# Altium footprint library connectors_USB_ETH.PcbLib: 71 footprints (part 2 of 5)
Each footprint in its own frame and in the unit in brackets; x right, y up, seen from the top. Pads: shape width x height; smd on the part's side, far side on the other; paste and mask are expansions set on the pad; w line width, h text height; cw(c..) or ccw(c..) is an arc to the next point about the centre after c.
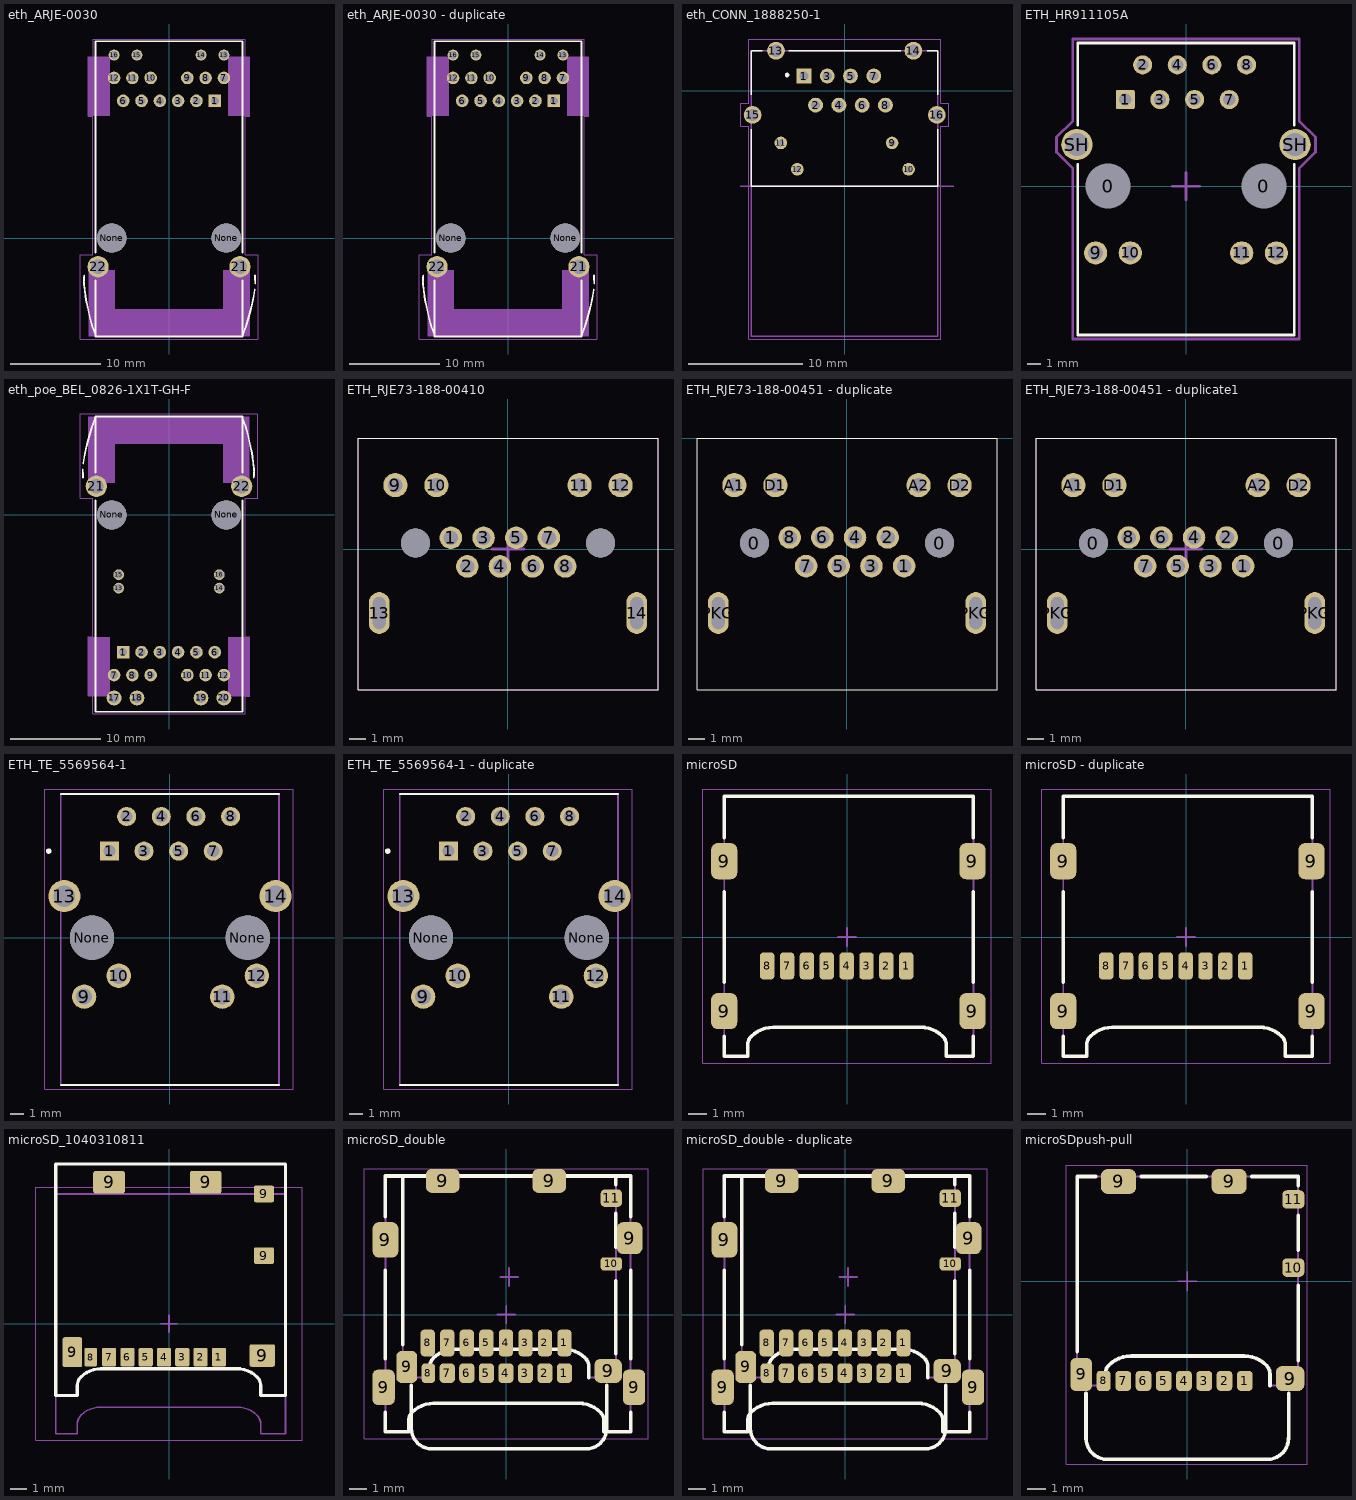
[diagram p1: the footprints below, top view; thin cyan lines are the x and y axes]

## eth_ARJE-0030 [mm] "ARJE-0030 magnet"
pads (20):
  rect 1.398x1.398 hole 0.89: 1(5.08,15.24)
  round 1.398 hole 0.89: 2(3.048,15.24) 3(1.016,15.24) 4(-1.016,15.24) 5(-3.048,15.24) 6(-5.08,15.24) 7(6.096,17.78) 8(4.064,17.78) 9(2.032,17.78) 10(-2.032,17.78) 11(-4.064,17.78) 12(-6.096,17.78)
  round 1.2 hole 0.89: 13(6.1,20.32) 14(3.56,20.32) 15(-3.56,20.32) 16(-6.1,20.32)
  round 2.362 hole 1.575: 21(7.875,-3.175) 22(-7.875,-3.175)
  round 3.25 hole 3.25 unplated: None(-6.35,0) None(6.35,0)
Top Overlay:
  lines w0.2: -9.46,-4.48 -9.42,-5.14 -9.36,-5.75 -9.28,-6.45 -9.22,-6.86 -9.03,-7.68 -8.75,-9 -8.48,-9.9 -8.17,-10.66 ; -9.45,-4.7 -9.44,-4.38 -9.4,-4.15 ; -8.155,-4.7 -8.155,-10.92 8.155,-10.92 8.155,-4.7 ; -8.155,-1.6 -8.155,21.85 8.155,21.85 8.155,-1.6 ; 8.14,-10.83 8.2,-10.74 8.31,-10.45 8.45,-10.04 8.6,-9.61 8.78,-9.05 ; 8.78,-9.02 9.05,-8.02 9.23,-7.26 9.33,-6.84 9.4,-6.4 9.51,-5.72 ; 9.53,-4.16 9.56,-4.56 9.58,-4.83 9.57,-5.03
M1_3D_TOP:
  region: 8.94,-10.92 -8.915,-10.92 -8.915,-7.892 8.94,-7.892
  region: 8.934,-8 5.995,-8 5.995,-3.557 8.934,-3.557
  region: -6.003,-8 -8.915,-8 -8.915,-3.555 -6.003,-3.555
  region: 8.93,13.6 6.555,13.6 6.555,20.104 8.93,20.104
  region: -6.568,13.6 -8.915,13.6 -8.915,20.109 -6.568,20.109
  region: 8.929,13.6 6.555,13.6 6.555,20.102 8.929,20.102
  region: -6.568,13.6 -8.915,13.6 -8.915,20.11 -6.568,20.11
  region: -6.566,13.6 -8.915,13.6 -8.915,20.104 -6.566,20.104
  region: 8.926,13.6 6.555,13.6 6.555,20.095 8.926,20.095
  region: 8.933,-10.92 -8.915,-10.92 -8.915,-7.886 8.933,-7.886
  region: 8.945,-7.87 5.995,-7.87 5.995,-3.562 8.945,-3.562
  region: -6.004,-7.87 -8.915,-7.87 -8.915,-3.555 -6.004,-3.555
  region: 8.939,-10.92 -8.915,-10.92 -8.915,-7.891 8.939,-7.891
  region: -6.011,-7.87 -8.915,-7.87 -8.915,-3.559 -6.011,-3.559
  region: 8.923,-7.87 5.995,-7.87 5.995,-3.553 8.923,-3.553
  lines w0.05: -9.85,-11.2 9.85,-11.2 9.85,-1.85 8.45,-1.85 8.45,13.55 8.95,13.55 8.95,20.1 8.45,20.1 8.45,22.1 -8.45,22.1 -8.45,20.15 -8.95,20.15 -8.95,13.55 -8.45,13.55 -8.45,-1.85 -9.85,-1.85 -9.85,-11.2
3D body "ARJE-0030.STEP": height 16.6, standoff -3.07, extent -10.352,-10.961 10.352,22.06

## eth_ARJE-0030 - duplicate [mm] "ARJE-0030 magnet"
pads (20):
  rect 1.398x1.398 hole 0.89: 1(5.08,15.24)
  round 1.398 hole 0.89: 2(3.048,15.24) 3(1.016,15.24) 4(-1.016,15.24) 5(-3.048,15.24) 6(-5.08,15.24) 7(6.096,17.78) 8(4.064,17.78) 9(2.032,17.78) 10(-2.032,17.78) 11(-4.064,17.78) 12(-6.096,17.78)
  round 1.2 hole 0.89: 13(6.1,20.32) 14(3.56,20.32) 15(-3.56,20.32) 16(-6.1,20.32)
  round 2.362 hole 1.575: 21(7.875,-3.175) 22(-7.875,-3.175)
  round 3.25 hole 3.25 unplated: None(-6.35,0) None(6.35,0)
Top Overlay:
  lines w0.2: -9.46,-4.48 -9.42,-5.14 -9.36,-5.75 -9.28,-6.45 -9.22,-6.86 -9.03,-7.68 -8.75,-9 -8.48,-9.9 -8.17,-10.66 ; -9.45,-4.7 -9.44,-4.38 -9.4,-4.15 ; -8.155,-4.7 -8.155,-10.92 8.155,-10.92 8.155,-4.7 ; -8.155,-1.6 -8.155,21.85 8.155,21.85 8.155,-1.6 ; 8.14,-10.83 8.2,-10.74 8.31,-10.45 8.45,-10.04 8.6,-9.61 8.78,-9.05 ; 8.78,-9.02 9.05,-8.02 9.23,-7.26 9.33,-6.84 9.4,-6.4 9.51,-5.72 ; 9.53,-4.16 9.56,-4.56 9.58,-4.83 9.57,-5.03
M1_3D_TOP:
  region: 8.94,-10.92 -8.915,-10.92 -8.915,-7.892 8.94,-7.892
  region: 8.934,-8 5.995,-8 5.995,-3.557 8.934,-3.557
  region: -6.003,-8 -8.915,-8 -8.915,-3.555 -6.003,-3.555
  region: 8.93,13.6 6.555,13.6 6.555,20.104 8.93,20.104
  region: -6.568,13.6 -8.915,13.6 -8.915,20.109 -6.568,20.109
  region: 8.929,13.6 6.555,13.6 6.555,20.102 8.929,20.102
  region: -6.568,13.6 -8.915,13.6 -8.915,20.11 -6.568,20.11
  region: -6.566,13.6 -8.915,13.6 -8.915,20.104 -6.566,20.104
  region: 8.926,13.6 6.555,13.6 6.555,20.095 8.926,20.095
  region: 8.933,-10.92 -8.915,-10.92 -8.915,-7.886 8.933,-7.886
  region: 8.945,-7.87 5.995,-7.87 5.995,-3.562 8.945,-3.562
  region: -6.004,-7.87 -8.915,-7.87 -8.915,-3.555 -6.004,-3.555
  region: 8.939,-10.92 -8.915,-10.92 -8.915,-7.891 8.939,-7.891
  region: -6.011,-7.87 -8.915,-7.87 -8.915,-3.559 -6.011,-3.559
  region: 8.923,-7.87 5.995,-7.87 5.995,-3.553 8.923,-3.553
  lines w0.05: -9.85,-11.2 9.85,-11.2 9.85,-1.85 8.45,-1.85 8.45,13.55 8.95,13.55 8.95,20.1 8.45,20.1 8.45,22.1 -8.45,22.1 -8.45,20.15 -8.95,20.15 -8.95,13.55 -8.45,13.55 -8.45,-1.85 -9.85,-1.85 -9.85,-11.2
3D body "ARJE-0030.STEP": height 16.6, standoff -3.07, extent -10.352,-10.961 10.352,22.06

## eth_CONN_1888250-1 [mm] "1888250-1"
pads (16):
  rect 1.3x1.3 hole 0.8: 1(-3.556,1.27)
  round 1.3 hole 0.8: 2(-2.54,-1.27) 3(-1.524,1.27) 4(-0.508,-1.27) 5(0.508,1.27) 6(1.524,-1.27) 7(2.54,1.27) 8(3.556,-1.27)
  round 1.1 hole 0.6: 9(4.14,-4.57) 10(5.58,-6.87) 11(-5.58,-4.57) 12(-4.14,-6.87)
  round 1.55 hole 1.05: 13(-6,3.48) 14(6,3.48) 15(-8.045,-2.12) 16(8.045,-2.12)
Top Overlay:
  circle w0.2: c-5.024,1.36 r0.1
  lines w0.127: -8.145,-3.37 -8.145,-8.37 8.145,-8.37 8.145,-3.37 ; -8.145,-0.37 -8.145,3.48 ; -8.1,3.48 -7.2,3.48 ; -4.9,3.48 4.9,3.48 ; 7.2,3.48 8.1,3.48 ; 8.145,-0.37 8.145,3.48
M1_3D_TOP:
  lines w0.05: -9.07,-3.12 -9.07,-1.12 -8.395,-1.12 -8.395,4.505 8.395,4.505 8.395,-1.12 9.07,-1.12 9.07,-3.12 8.395,-3.12 8.395,-21.69 -8.395,-21.69 -8.395,-3.12 -9.07,-3.12
  lines w0.127: -9.1,-8.37 9.5,-8.37 ; -8.145,-21.44 8.145,-21.44 8.145,3.48 -8.145,3.48 -8.145,-21.44
  text "PCB EDGE" at 9.716,-8.363 h1.88
3D body "c-1888250-1-b-3d.stp": height 8.49, standoff -5.29, extent -9.245,-22.519 9.245,4.216

## ETH_HR911105A [mm] "HR911105A"
pads (16):
  round 3 hole 3.3: 0(-5.715,0.01) 0(5.715,0.01)
  rrect20% 1.4x1.4 hole 0.89: 1(-4.45,6.36)
  round 1.4 hole 0.89: 2(-3.18,8.9) 3(-1.91,6.36) 4(-0.64,8.9) 5(0.63,6.36) 6(1.9,8.9) 7(3.17,6.36) 8(4.44,8.9)
  round 1.7 hole 1.1: 9(-6.625,-4.89) 10(-4.085,-4.89) 11(4.085,-4.89) 12(6.625,-4.89)
  round 2.3 hole 1.7: SH(-8,3.06) SH(8,3.06)
Top Overlay:
  lines w0.2: -7.94,1.6 -7.94,-10.9 7.94,-10.9 7.94,1.6 ; -7.94,4.5 -7.94,10.5 7.94,10.5 7.94,4.5
M3_comm_top:
  text ".comment" at -2.6,-2.4 h2
M5_asm_top:
  text ".Designator" at -3.35,2.16 h2
M7_courtyard_top:
  lines w0.2: -1,0.01 1,0.01 ; 0,-0.99 0,1.01 ; -9.5,2.5 -9.5,3.6 -8.3,4.8 -8.3,10.8 8.3,10.8 8.3,4.8 9.5,3.6 9.5,2.5 8.3,1.3 8.3,-11.2 -8.3,-11.2 -8.3,1.3 -9.5,2.5
3D body "HR911105A.step": height 13.6, standoff -2.9, extent -7.94,-10.91 7.94,10.49

## eth_poe_BEL_0826-1X1T-GH-F [mm] "0826-1X1T-GH-F"
pads (24):
  rect 1.398x1.398 hole 0.89: 1(-5.08,-15.24)
  round 1.398 hole 0.89: 2(-3.048,-15.24) 3(-1.016,-15.24) 4(1.016,-15.24) 5(3.048,-15.24) 6(5.08,-15.24) 7(-6.096,-17.78) 8(-4.064,-17.78) 9(-2.032,-17.78) 10(2.032,-17.78) 11(4.064,-17.78) 12(6.096,-17.78)
  round 1.2 hole 0.89: 13(-5.588,-8.13) 14(5.588,-8.13) 15(-5.588,-6.64) 16(5.588,-6.64)
  round 1.65 hole 1.1: 17(-6.096,-20.32) 18(-3.556,-20.32) 19(3.556,-20.32) 20(6.096,-20.32)
  round 2.362 hole 1.575: 21(-8.065,3.175) 22(8.065,3.175)
  round 3.25 hole 3.25 unplated: None(-6.35,0) None(6.35,0)
Top Overlay:
  lines w0.2: -9.57,5.03 -9.58,4.83 -9.56,4.56 -9.53,4.16 ; -9.51,5.72 -9.4,6.4 -9.33,6.84 -9.23,7.26 -9.05,8.02 -8.78,9.02 ; -8.78,9.05 -8.6,9.61 -8.45,10.04 -8.31,10.45 -8.2,10.74 -8.14,10.83 ; -8.155,1.6 -8.155,-21.85 8.155,-21.85 8.155,1.6 ; -8.155,4.7 -8.155,10.92 8.155,10.92 8.155,4.7 ; 8.17,10.66 8.48,9.9 8.75,9 9.03,7.68 9.22,6.86 9.28,6.45 9.36,5.75 9.42,5.14 9.46,4.48 ; 9.4,4.15 9.44,4.38 9.45,4.7
M1_3D_TOP:
  region: -8.94,10.92 8.915,10.92 8.915,7.892 -8.94,7.892
  region: -8.934,8 -5.995,8 -5.995,3.557 -8.934,3.557
  region: 6.003,8 8.915,8 8.915,3.555 6.003,3.555
  region: -8.93,-13.6 -6.555,-13.6 -6.555,-20.104 -8.93,-20.104
  region: 6.568,-13.6 8.915,-13.6 8.915,-20.109 6.568,-20.109
  region: -8.929,-13.6 -6.555,-13.6 -6.555,-20.102 -8.929,-20.102
  region: 6.568,-13.6 8.915,-13.6 8.915,-20.11 6.568,-20.11
  region: 6.566,-13.6 8.915,-13.6 8.915,-20.104 6.566,-20.104
  region: -8.926,-13.6 -6.555,-13.6 -6.555,-20.095 -8.926,-20.095
  region: -8.933,10.92 8.915,10.92 8.915,7.886 -8.933,7.886
  region: -8.945,7.87 -5.995,7.87 -5.995,3.562 -8.945,3.562
  region: 6.004,7.87 8.915,7.87 8.915,3.555 6.004,3.555
  region: -8.939,10.92 8.915,10.92 8.915,7.891 -8.939,7.891
  region: 6.011,7.87 8.915,7.87 8.915,3.559 6.011,3.559
  region: -8.923,7.87 -5.995,7.87 -5.995,3.553 -8.923,3.553
  lines w0.05: -9.85,1.85 -8.45,1.85 -8.45,-13.55 -8.95,-13.55 -8.95,-20.1 -8.45,-20.1 -8.45,-22.1 8.45,-22.1 8.45,-20.15 8.95,-20.15 8.95,-13.55 8.45,-13.55 8.45,1.85 9.85,1.85 9.85,11.2 -9.85,11.2 -9.85,1.85

## ETH_RJE73-188-00410 [mm] "RJE73-188-00410"
pads (16):
  round 1.4 hole 0.89: 1(-3.55,0.705) 2(-2.53,-1.075) 3(-1.52,0.705) 4(-0.5,-1.075) 5(0.51,0.705) 6(1.53,-1.075) 7(2.54,0.705) 8(3.56,-1.075)
  round 1.5 hole 0.89: 9(-7,3.975) 10(-4.45,3.975) 11(4.45,3.975) 12(7,3.975)
  oval 1.3x2.6 hole 0.8 slot 2 at 90 deg: 13(-8,-3.975) 14(8,-3.975)
  round 1.8 hole 1.8: ""(-5.75,0.375) ""(5.75,0.375)
Top Overlay:
  lines w0.05: -9.322,-8.725 -9.322,6.875 9.322,6.875 9.322,-8.725 -9.322,-8.725
M3_comm_top:
  text ".comment" at -2.8,-0.2 h2
M5_asm_top:
  lines w0.05: -9.322,-8.725 9.322,-8.725 9.322,6.875 -9.322,6.875 -9.322,-8.725
  text ".Designator" at -3.4,5.9 h2
M7_courtyard_top:
  lines w0.05: -9.322,-8.725 9.322,-8.725 9.322,6.875 -9.322,6.875 -9.322,-8.725
  lines w0.2: -1,0 1,0 ; 0,-1 0,1
3D body "M-RJE73-188-00XX1-REVT1.STEP": height 13.32, standoff -2.05, extent -9.871,-8.634 9.876,6.615

## ETH_RJE73-188-00451 - duplicate [mm] "RJE73-188-00451"
pads (16):
  round 1.8 hole 1.8: 0(-5.75,-6.5) 0(5.75,-6.5)
  round 1.4 hole 0.89: 1(3.55,-7.93) 2(2.53,-6.15) 3(1.52,-7.93) 4(0.5,-6.15) 5(-0.51,-7.93) 6(-1.53,-6.15) 7(-2.54,-7.93) 8(-3.56,-6.15)
  round 1.5 hole 0.89: A1(-7,-2.9) A2(4.45,-2.9) D1(-4.45,-2.9) D2(7,-2.9)
  oval 1.3x2.6 hole 0.8 slot 2 at 90 deg: PKG(-8,-10.85) PKG(8,-10.85)
Top Overlay:
  lines w0.05: -9.322,-15.6 9.322,-15.6 9.322,0 -9.322,0 -9.322,-15.6
3D body "M-RJE73-188-00XX1-REVT1.STEP": height 13.32, standoff -2.05, extent -9.871,-15.509 9.876,-0.26

## ETH_RJE73-188-00451 - duplicate1 [mm] "RJE73-188-00451"
pads (16):
  round 1.8 hole 1.8: 0(-5.75,0.375) 0(5.75,0.375)
  round 1.4 hole 0.89: 1(3.55,-1.055) 2(2.53,0.725) 3(1.52,-1.055) 4(0.5,0.725) 5(-0.51,-1.055) 6(-1.53,0.725) 7(-2.54,-1.055) 8(-3.56,0.725)
  round 1.5 hole 0.89: A1(-7,3.975) A2(4.45,3.975) D1(-4.45,3.975) D2(7,3.975)
  oval 1.3x2.6 hole 0.8 slot 2 at 90 deg: PKG(-8,-3.975) PKG(8,-3.975)
Top Overlay:
  lines w0.05: -9.322,-8.725 -9.322,6.875 9.322,6.875 9.322,-8.725 -9.322,-8.725
M3_comm_top:
  text ".comment" at -2.8,-0.2 h2
M5_asm_top:
  lines w0.05: -9.322,-8.725 9.322,-8.725 9.322,6.875 -9.322,6.875 -9.322,-8.725
  text ".Designator" at -3.4,5.9 h2
M7_courtyard_top:
  lines w0.05: -9.322,-8.725 9.322,-8.725 9.322,6.875 -9.322,6.875 -9.322,-8.725
  lines w0.2: -1,0 1,0 ; 0,-1 0,1
3D body "M-RJE73-188-00XX1-REVT1.STEP": height 13.32, standoff -2.05, extent -9.871,-8.634 9.876,6.615

## ETH_TE_5569564-1 [mm]
pads (16):
  rect 1.398x1.398 hole 0.89: 1(-4.445,6.35)
  round 1.398 hole 0.89: 2(-3.175,8.89) 3(-1.905,6.35) 4(-0.635,8.89) 5(0.635,6.35) 6(1.905,8.89) 7(3.175,6.35) 8(4.445,8.89)
  round 1.785 hole 1.19: 9(-6.295,-4.32) 10(-3.755,-2.79) 11(3.835,-4.32) 12(6.375,-2.79)
  round 2.355 hole 1.57: 13(-7.745,3.05) 14(7.745,3.05)
  round 3.25 hole 3.25 unplated: None(-5.715,0) None(5.715,0)
Top Overlay:
  circle w0.2: c-8.89,6.35 r0.1
  lines w0.127: -8,-10.8 8,-10.8 ; -8,10.54 8,10.54
M1_3D_TOP:
  circle w0.2: c-4.445,6.35 r0.1
  lines w0.05: -9.195,-11.095 -9.195,10.905 9.055,10.905 9.055,-11.095 -9.195,-11.095
  lines w0.127: -8,-10.8 -8,10.54 ; 8,-10.8 8,10.54
3D body "c-5569564-1-e1-3d.stp": height 14.72, standoff -3.94, extent -8.001,-10.786 8.001,10.55

## ETH_TE_5569564-1 - duplicate [mm]
pads (16):
  rect 1.398x1.398 hole 0.89: 1(-4.445,6.35)
  round 1.398 hole 0.89: 2(-3.175,8.89) 3(-1.905,6.35) 4(-0.635,8.89) 5(0.635,6.35) 6(1.905,8.89) 7(3.175,6.35) 8(4.445,8.89)
  round 1.785 hole 1.19: 9(-6.295,-4.32) 10(-3.755,-2.79) 11(3.835,-4.32) 12(6.375,-2.79)
  round 2.355 hole 1.57: 13(-7.745,3.05) 14(7.745,3.05)
  round 3.25 hole 3.25 unplated: None(-5.715,0) None(5.715,0)
Top Overlay:
  circle w0.2: c-8.89,6.35 r0.1
  lines w0.127: -8,-10.8 8,-10.8 ; -8,10.54 8,10.54
M1_3D_TOP:
  circle w0.2: c-4.445,6.35 r0.1
  lines w0.05: -9.195,-11.095 9.055,-11.095 9.055,10.905 -9.195,10.905 -9.195,-11.095
  lines w0.127: -8,-10.8 -8,10.54 ; 8,-10.8 8,10.54

## microSD [mm] "5190008-X9H, IPC High Density"
height 1.75
pads (12):
  rrect50% 0.8x1.5 smd: 1(3.28,-1.6) 2(2.18,-1.6) 3(1.08,-1.6) 4(-0.02,-1.6) 5(-1.12,-1.6) 6(-2.22,-1.6) 7(-3.32,-1.6) 8(-4.42,-1.6)
  rrect50% 1.45x2 smd: 9(-6.8,-4.1) 9(-6.8,4.2) 9(6.95,-4.1) 9(6.95,4.2)
Top Overlay:
  lines w0.2: -6.8,-5.5 -6.8,-6.6 -5.5,-6.6 -5.5,-5.983 cw(c-4.817,-5.983) -5.3,-5.5 cw(c-4.093,-6.707) -4.093,-5 4.293,-5 ; -6.8,-2.5 -6.8,2.5 ; -6.8,5.5 -6.8,7.8 7,7.8 7,5.5 ; 4.093,-5 cw(c4.093,-6.707) 5.3,-5.5 cw(c4.817,-5.983) 5.5,-5.983 5.5,-6.6 7,-6.6 7,-5.5 ; 7,-2.5 7,2.5
Mechanical 13:
  lines w0.1: -6.8,-6.6 -5.5,-6.6 -5.5,-5.99 cw(c-4.8,-5.99) -5.295,-5.495 cw(c-4.1,-6.69) -4.1,-5 4.093,-5 cw(c4.093,-6.707) 5.3,-5.5 cw(c4.817,-5.983) 5.5,-5.983 5.5,-6.6 7,-6.6 7,7.8 -6.8,7.8 -6.8,-6.6
Mechanical 15:
  lines w0.05: -8,-7 -8,8.2 8,8.2 8,-7 -8,-7
  lines w0.1: -0.5,0 0.5,0 ; 0,-0.5 0,0.5
3D body "472192001.stp": height 2.06, standoff 0.17, extent -7.2,-6.65 7.4,7.85

## microSD - duplicate [mm] "5190008-X9H, IPC High Density"
height 1.75
pads (12):
  rrect50% 0.8x1.5 smd: 1(3.28,-1.6) 2(2.18,-1.6) 3(1.08,-1.6) 4(-0.02,-1.6) 5(-1.12,-1.6) 6(-2.22,-1.6) 7(-3.32,-1.6) 8(-4.42,-1.6)
  rrect50% 1.45x2 smd: 9(-6.8,-4.1) 9(-6.8,4.2) 9(6.95,-4.1) 9(6.95,4.2)
Top Overlay:
  lines w0.2: -6.8,-5.5 -6.8,-6.6 -5.5,-6.6 -5.5,-5.983 cw(c-4.817,-5.983) -5.3,-5.5 cw(c-4.093,-6.707) -4.093,-5 4.293,-5 ; -6.8,-2.5 -6.8,2.5 ; -6.8,5.5 -6.8,7.8 7,7.8 7,5.5 ; 4.093,-5 cw(c4.093,-6.707) 5.3,-5.5 cw(c4.817,-5.983) 5.5,-5.983 5.5,-6.6 7,-6.6 7,-5.5 ; 7,-2.5 7,2.5
Mechanical 13:
  lines w0.1: -6.8,-6.6 -6.8,7.8 7,7.8 7,-6.6 5.5,-6.6 5.5,-5.983 ccw(c4.817,-5.983) 5.3,-5.5 ccw(c4.093,-6.707) 4.093,-5 -4.1,-5 ccw(c-4.1,-6.69) -5.295,-5.495 ccw(c-4.8,-5.99) -5.5,-5.99 -5.5,-6.6 -6.8,-6.6
Mechanical 15:
  lines w0.05: -8,-7 8,-7 8,8.2 -8,8.2 -8,-7
  lines w0.1: -0.5,0 0.5,0 ; 0,-0.5 0,0.5
3D body "472192001.stp": height 2.06, standoff 0.17, extent -7.2,-6.65 7.4,7.85

## microSD_1040310811 [mm] "1040310811, CONN MICRO SD CARD PUSH-PULL R/A"
height 1.75
pads (14):
  rrect20% 0.85x1.1 smd: 1(3,-2) 2(1.9,-2) 3(0.8,-2) 4(-0.3,-2) 5(-1.4,-2) 6(-2.5,-2) 7(-3.6,-2)
  rrect20% 0.75x1.1 smd: 8(-4.7,-2)
  rrect20% 1.17x1.8 smd: 9(-5.8,-1.7)
  rrect20% 1.9x1.35 smd: 9(-3.6,8.5) 9(2.2,8.5)
  rrect20% 1.55x1.35 smd: 9(5.6,-1.9)
  rrect20% 1.2x1 smd: 9(5.7,4.1) 9(5.7,7.8)
Top Overlay:
  lines w0.2: 4.093,-2.7 cw(c4.093,-4.407) 5.3,-3.2 cw(c4.817,-3.683) 5.5,-3.683 5.5,-4.3 7,-4.3 7,-3.2 7,2.5 7,9.6 -6.8,9.6 -6.8,5.5 -6.8,-3.2 -6.8,-4.3 -5.5,-4.3 -5.5,-3.683 cw(c-4.817,-3.683) -5.3,-3.2 cw(c-4.093,-4.407) -4.093,-2.7 4.293,-2.7
Mechanical 13:
  lines w0.1: -6.8,-6.6 -5.5,-6.6 -5.5,-5.99 cw(c-4.8,-5.99) -5.295,-5.495 cw(c-4.1,-6.69) -4.1,-5 4.093,-5 cw(c4.093,-6.707) 5.3,-5.5 cw(c4.817,-5.983) 5.5,-5.983 5.5,-6.6 7,-6.6 7,7.8 -6.8,7.8 -6.8,-6.6
Mechanical 15:
  lines w0.05: -8,-7 -8,8.2 8,8.2 8,-7 -8,-7
  lines w0.1: -0.5,0 0.5,0 ; 0,-0.5 0,0.5
3D body "User Library-1040310811.STEP": height 1.44, standoff -0.01, extent -6.075,-2.3 5.875,9.1

## microSD_double [mm] "1040310811 + 0472192001"
height 1.75
pads (26):
  rrect50% 0.85x1.1 smd: 1(3.28,-3.3) 2(2.18,-3.3) 3(1.08,-3.3) 4(-0.02,-3.3) 5(-1.12,-3.3) 6(-2.22,-3.3) 7(-3.32,-3.3)
  rrect50% 0.8x1.5 smd: 1(3.28,-1.6) 2(2.18,-1.6) 3(1.08,-1.6) 4(-0.02,-1.6) 5(-1.12,-1.6) 6(-2.22,-1.6) 7(-3.32,-1.6) 8(-4.42,-1.6)
  rrect50% 0.75x1.1 smd: 8(-4.385,-3.3)
  rrect50% 1.25x2 smd: 9(-6.9,-4.1) 9(7.2,-4.1)
  rrect50% 1.45x2 smd: 9(-6.8,4.2)
  rrect50% 1.17x1.8 smd: 9(-5.6,-2.95)
  rrect50% 1.9x1.35 smd: 9(-3.575,7.525) 9(2.425,7.525)
  rrect50% 1.55x1.35 smd: 9(5.74,-3.175)
  rrect50% 1.45x1.8 smd: 9(6.95,4.3)
  rrect50% 1.2x0.75 smd: 10(5.915,2.85)
  rrect50% 1.2x1 smd: 11(5.915,6.55)
Top Overlay:
  lines w0.2: -6.8,-5.5 -6.8,-6.6 -5.5,-6.6 -5.5,-5.983 cw(c-4.817,-5.983) -5.3,-5.5 cw(c-4.093,-6.707) -4.093,-5 4.293,-5 ; -6.8,-2.5 -6.8,2.5 ; -6.8,5.5 -6.8,7.8 7,7.8 7,5.5 ; -5.825,-1.7 -5.825,7.8 -4.825,7.8 ; -5.343,-6.463 -5.343,-3.988 ; -5.338,-6.412 ccw(c-4.188,-6.412) -4.188,-7.562 ; -4.3,-3.55 -4.3,-2.933 cw(c-3.617,-2.933) -4.1,-2.45 cw(c-2.893,-3.657) -2.893,-1.95 3.243,-1.95 cw(c3.243,-3.657) 4.45,-2.45 cw(c3.967,-2.933) 4.65,-2.933 4.65,-3.55 ; -4.243,-7.562 4.503,-7.562 ccw(c4.503,-6.412) 5.653,-6.412 ; -2.325,7.8 1.175,7.8 ; 3.675,7.8 6.175,7.8 6.175,7.3 ; 4.093,-5 cw(c4.093,-6.707) 5.3,-5.5 cw(c4.817,-5.983) 5.5,-5.983 5.5,-6.6 7,-6.6 7,-5.5 ; 5.657,-6.463 5.657,-3.988 ; 6.175,-2.2 6.175,1.9 ; 6.175,3.8 6.175,5.7 ; 7,-2.5 7,2.5
Mechanical 13:
  lines w0.1: -5.825,-3.55 -5.825,7.8 6.175,7.8 6.175,-3.55 ; -5.8,-3.55 -4.3,-3.55 -4.3,-2.933 cw(c-3.617,-2.933) -4.1,-2.45 cw(c-2.893,-3.657) -2.893,-1.95 3.268,-1.95 ; 3.243,-1.95 cw(c3.243,-3.657) 4.45,-2.45 cw(c3.967,-2.933) 4.65,-2.933 4.65,-3.55 6.15,-3.55 ; -6.8,-6.6 -5.5,-6.6 -5.5,-5.99 cw(c-4.8,-5.99) -5.295,-5.495 cw(c-4.1,-6.69) -4.1,-5 4.093,-5 cw(c4.093,-6.707) 5.3,-5.5 cw(c4.817,-5.983) 5.5,-5.983 5.5,-6.6 7,-6.6 7,7.8 -6.8,7.8 -6.8,-6.6
Mechanical 15:
  lines w0.05: -8,-7 -8,8.2 8,8.2 8,-7 -8,-7
  lines w0.1: -0.5,0 0.5,0 ; -0.343,2.113 0.657,2.113 ; 0,-0.5 0,0.5 ; 0.157,1.613 0.157,2.612
3D body "1040310811.stp": height 1.44, standoff -0.01, extent -5.8,-3.55 6.15,7.85
3D body "472192001.stp": height 2.06, standoff 0.17, extent -7.2,-6.65 7.4,7.85

## microSD_double - duplicate [mm] "1040310811 + 0472192001"
height 1.75
pads (26):
  rrect50% 0.85x1.1 smd: 1(3.28,-3.3) 2(2.18,-3.3) 3(1.08,-3.3) 4(-0.02,-3.3) 5(-1.12,-3.3) 6(-2.22,-3.3) 7(-3.32,-3.3)
  rrect50% 0.8x1.5 smd: 1(3.28,-1.6) 2(2.18,-1.6) 3(1.08,-1.6) 4(-0.02,-1.6) 5(-1.12,-1.6) 6(-2.22,-1.6) 7(-3.32,-1.6) 8(-4.42,-1.6)
  rrect50% 0.75x1.1 smd: 8(-4.385,-3.3)
  rrect50% 1.25x2 smd: 9(-6.9,-4.1) 9(7.2,-4.1)
  rrect50% 1.45x2 smd: 9(-6.8,4.2)
  rrect50% 1.17x1.8 smd: 9(-5.6,-2.95)
  rrect50% 1.9x1.35 smd: 9(-3.575,7.525) 9(2.425,7.525)
  rrect50% 1.55x1.35 smd: 9(5.74,-3.175)
  rrect50% 1.45x1.8 smd: 9(6.95,4.3)
  rrect50% 1.2x0.75 smd: 10(5.915,2.85)
  rrect50% 1.2x1 smd: 11(5.915,6.55)
Top Overlay:
  lines w0.2: -6.8,-5.5 -6.8,-6.6 -5.5,-6.6 -5.5,-5.983 cw(c-4.817,-5.983) -5.3,-5.5 cw(c-4.093,-6.707) -4.093,-5 4.293,-5 ; -6.8,-2.5 -6.8,2.5 ; -6.8,5.5 -6.8,7.8 7,7.8 7,5.5 ; -5.825,-1.7 -5.825,7.8 -4.825,7.8 ; -5.343,-6.463 -5.343,-3.988 ; -5.338,-6.412 ccw(c-4.188,-6.412) -4.188,-7.562 ; -4.3,-3.55 -4.3,-2.933 cw(c-3.617,-2.933) -4.1,-2.45 cw(c-2.893,-3.657) -2.893,-1.95 3.243,-1.95 cw(c3.243,-3.657) 4.45,-2.45 cw(c3.967,-2.933) 4.65,-2.933 4.65,-3.55 ; -4.243,-7.562 4.503,-7.562 ccw(c4.503,-6.412) 5.653,-6.412 ; -2.325,7.8 1.175,7.8 ; 3.675,7.8 6.175,7.8 6.175,7.3 ; 4.093,-5 cw(c4.093,-6.707) 5.3,-5.5 cw(c4.817,-5.983) 5.5,-5.983 5.5,-6.6 7,-6.6 7,-5.5 ; 5.657,-6.463 5.657,-3.988 ; 6.175,-2.2 6.175,1.9 ; 6.175,3.8 6.175,5.7 ; 7,-2.5 7,2.5
Mechanical 13:
  lines w0.1: -5.825,-3.55 -5.825,7.8 6.175,7.8 6.175,-3.55 ; -5.8,-3.55 -4.3,-3.55 -4.3,-2.933 cw(c-3.617,-2.933) -4.1,-2.45 cw(c-2.893,-3.657) -2.893,-1.95 3.268,-1.95 ; 3.243,-1.95 cw(c3.243,-3.657) 4.45,-2.45 cw(c3.967,-2.933) 4.65,-2.933 4.65,-3.55 6.15,-3.55 ; -6.8,-6.6 -5.5,-6.6 -5.5,-5.99 cw(c-4.8,-5.99) -5.295,-5.495 cw(c-4.1,-6.69) -4.1,-5 4.093,-5 cw(c4.093,-6.707) 5.3,-5.5 cw(c4.817,-5.983) 5.5,-5.983 5.5,-6.6 7,-6.6 7,7.8 -6.8,7.8 -6.8,-6.6
Mechanical 15:
  lines w0.05: -8,-7 -8,8.2 8,8.2 8,-7 -8,-7
  lines w0.1: -0.5,0 0.5,0 ; -0.343,2.113 0.657,2.113 ; 0,-0.5 0,0.5 ; 0.157,1.613 0.157,2.612
3D body "1040310811.stp": height 1.44, standoff -0.01, extent -5.8,-3.55 6.15,7.85
3D body "472192001.stp": height 2.06, standoff 0.17, extent -7.2,-6.65 7.4,7.85

## microSDpush-pull [mm] "1040310811 molex"
height 1.75
pads (14):
  rrect50% 0.85x1.1 smd: 1(3.123,-5.412) 2(2.023,-5.412) 3(0.923,-5.412) 4(-0.178,-5.412) 5(-1.278,-5.412) 6(-2.378,-5.412) 7(-3.478,-5.412)
  rrect50% 0.75x1.1 smd: 8(-4.543,-5.412)
  rrect50% 1.17x1.8 smd: 9(-5.757,-5.062)
  rrect50% 1.9x1.35 smd: 9(-3.732,5.413) 9(2.268,5.413)
  rrect50% 1.55x1.35 smd: 9(5.583,-5.288)
  rrect50% 1.2x1 smd: 10(5.758,0.738) 11(5.758,4.437)
Top Overlay:
  lines w0.2: -5.983,-3.812 -5.983,5.687 -4.982,5.687 ; -5.5,-8.575 -5.5,-6.1 ; -5.496,-8.525 ccw(c-4.346,-8.525) -4.346,-9.675 ; -4.457,-5.663 -4.457,-5.045 cw(c-3.775,-5.045) -4.257,-4.563 cw(c-3.05,-5.77) -3.05,-4.063 3.085,-4.063 cw(c3.085,-5.77) 4.293,-4.563 cw(c3.81,-5.045) 4.493,-5.045 4.493,-5.663 ; -4.4,-9.675 4.346,-9.675 ccw(c4.346,-8.525) 5.496,-8.525 ; -2.482,5.687 1.018,5.687 ; 3.518,5.687 6.018,5.687 6.018,5.188 ; 5.5,-8.575 5.5,-6.1 ; 6.018,-4.312 6.018,-0.212 ; 6.018,1.688 6.018,3.588
Mechanical 13:
  lines w0.1: -5.983,-5.663 -5.983,5.687 6.018,5.687 6.018,-5.663 ; -5.957,-5.663 -4.457,-5.663 -4.457,-5.045 cw(c-3.775,-5.045) -4.257,-4.563 cw(c-3.05,-5.77) -3.05,-4.063 3.11,-4.063 ; 3.085,-4.063 cw(c3.085,-5.77) 4.293,-4.563 cw(c3.81,-5.045) 4.493,-5.045 4.493,-5.663 5.993,-5.663
Mechanical 15:
  lines w0.05: -6.582,-9.925 -6.582,6.288 6.518,6.288 6.518,-9.925 -6.582,-9.925
  lines w0.1: -0.5,0 0.5,0 ; 0,-0.5 0,0.5
3D body "1040310811.stp": height 1.44, standoff -0.01, extent -5.957,-5.663 5.993,5.738